# Altium footprint library Miscellaneous Devices.PcbLib: 277 footprints (part 8 of 18)
Each footprint in its own frame and in the unit in brackets; x right, y up, seen from the top. Pads: shape width x height; smd on the part's side, far side on the other; paste and mask are expansions set on the pad; w line width, h text height; cw(c..) or ccw(c..) is an arc to the next point about the centre after c.
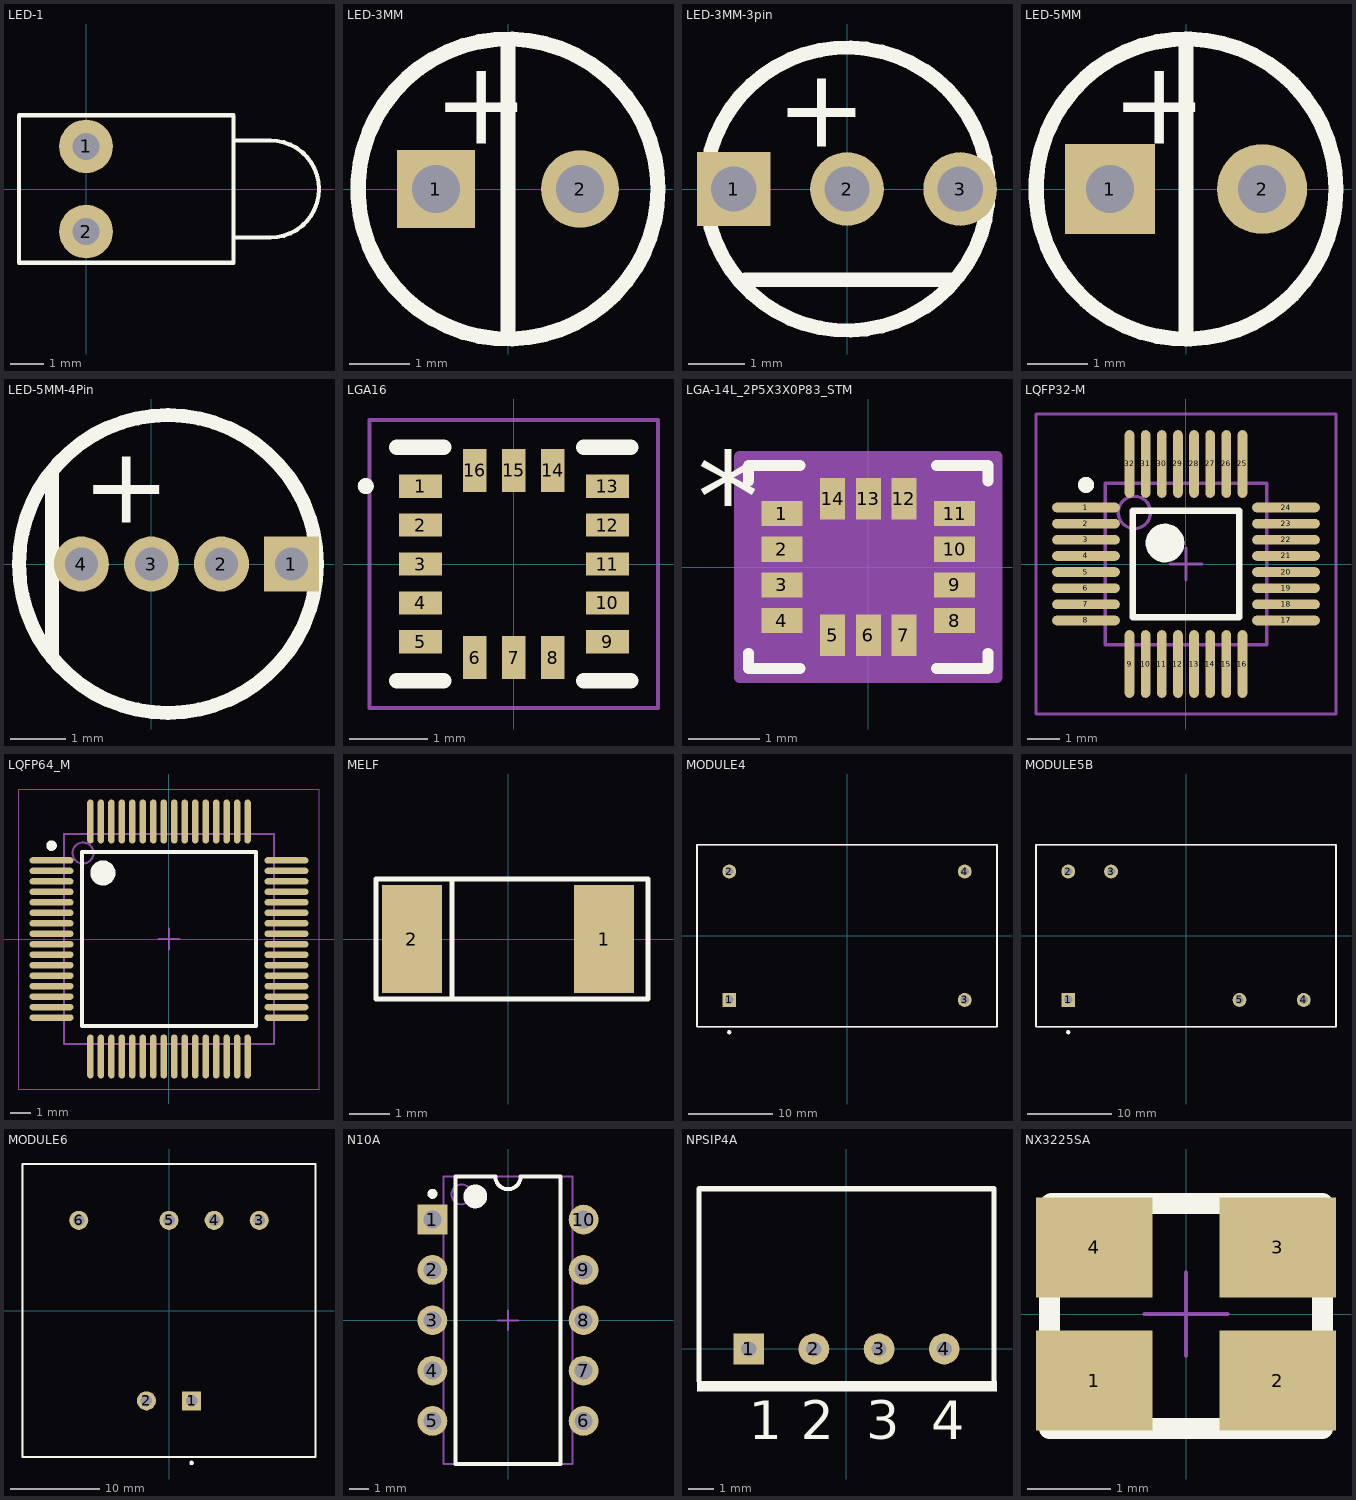
[diagram p7: the footprints below, top view; thin cyan lines are the x and y axes]

## LED-1 [mm] "LED; 2 Leads"
pads (2):
  round 1.6 hole 0.8: 1(0,1.27) 2(0,-1.27)
Top Overlay:
  lines w0.127: 4.4,-1.45 5.5,-1.45 ccw(c5.5,0) 5.5,1.45 4.4,1.45 ; -2,-2.2 -2,2.2 4.4,2.2 4.4,-2.2 -2,-2.2

## LED-3MM [mm] "LED-3MM"
pads (2):
  rect 1.3x1.3 hole 0.8: 1(-1.2,0)
  round 1.3 hole 0.8: 2(1.2,0)
Top Overlay:
  circle w0.254: c0,0 r2.5
  lines w0.254: 0,-2.425 0,2.475
  text "+" at -1.25,0.75 h1.4
3D body "CircuitWorks-LED DIP 3MM.step": height 6.5, standoff -2, extent -1.825,-1.925 1.675,1.875

## LED-3MM-3pin [mm] "LED-3MM 3 Pin comm cathode"
pads (3):
  rect 1.3x1.3 hole 0.8: 1(-2,0)
  round 1.3 hole 0.8: 2(0,0) 3(2,0)
Top Overlay:
  circle w0.254: c0,0 r2.5
  lines w0.254: -1.8,-1.6 1.9,-1.6
  text "+" at -1.25,0.75 h1.4
3D body "User Library-LED RG.step": height 9.43, standoff -4, extent -2.25,-2 2.25,2

## LED-5MM [mm] "LED-5MM"
pads (2):
  rect 1.5x1.5 hole 0.8: 1(-1.27,0)
  round 1.5 hole 0.8: 2(1.27,0)
Top Overlay:
  circle w0.254: c0,0 r2.5
  lines w0.254: 0,-2.5 0,2.5
  text "+" at -1.25,0.75 h1.4
3D body "User Library-LED5ON-Red.STEP": height 8.5, standoff -5, extent -3,-3 2.5,3

## LED-5MM-4Pin [mm] "LED-5MM-4Pin"
pads (4):
  rect 1x1 hole 0.6: 1(2.54,0)
  round 1 hole 0.6: 2(1.27,0) 3(0,0) 4(-1.27,0)
Top Overlay:
  circle w0.254: c0.3,0 r2.702
  lines w0.254: -1.8,-1.7 -1.8,1.6
  text "+" at -1.25,0.75 h1.4
3D body "User Library-LED5ON-Red.STEP": height 8.5, standoff -5, extent -2.5,-2.9 3,3.1

## LGA16 [mm]
pads (16):
  rect 0.55x0.3 smd: 1(-1.2,1) 2(-1.2,0.5) 3(-1.2,0) 4(-1.2,-0.5) 5(-1.2,-1) 9(1.2,-1) 10(1.2,-0.5) 11(1.2,0) 12(1.2,0.5) 13(1.2,1)
  rect 0.3x0.55 smd: 6(-0.5,-1.2) 7(0,-1.2) 8(0.5,-1.2) 14(0.5,1.2) 15(0,1.2) 16(-0.5,1.2)
Top Overlay:
  region: -2,1 -2,1.003 -2,1.008 -1.999,1.013 -1.998,1.018 -1.997,1.023 -1.996,1.028 -1.994,1.033 -1.992,1.038 -1.99,1.043 -1.988,1.048 -1.985,1.052 -1.982,1.057 -1.979,1.061 -1.976,1.065 -1.973,1.069 -1.969,1.073 -1.965,1.076 -1.961,1.079 -1.957,1.082 -1.952,1.085 -1.948,1.088 -1.943,1.09 -1.938,1.092 -1.933,1.094 -1.928,1.096 -1.923,1.097 -1.918,1.098 -1.913,1.099 -1.908,1.1 -1.903,1.1 -1.9,1.1 -1.897,1.1 -1.892,1.1 -1.887,1.099 -1.882,1.098 -1.877,1.097 -1.872,1.096 -1.867,1.094 -1.862,1.092 -1.857,1.09 -1.852,1.088 -1.848,1.085 -1.843,1.082 -1.839,1.079 -1.835,1.076 -1.831,1.073 -1.827,1.069 -1.824,1.065 -1.821,1.061 -1.818,1.057 -1.815,1.052 -1.812,1.048 -1.81,1.043 -1.808,1.038 -1.806,1.033 -1.804,1.028 -1.803,1.023 -1.802,1.018 -1.801,1.013 -1.8,1.008 -1.8,1.003 -1.8,1 -1.8,0.997 -1.8,0.992 -1.801,0.987 -1.802,0.982 -1.803,0.977 -1.804,0.972 -1.806,0.967 -1.808,0.962 -1.81,0.957 -1.812,0.952 -1.815,0.948 -1.818,0.943 -1.821,0.939 -1.824,0.935 -1.827,0.931 -1.831,0.927 -1.835,0.924 -1.839,0.921 -1.843,0.918 -1.848,0.915 -1.852,0.912 -1.857,0.91 -1.862,0.908 -1.867,0.906 -1.872,0.904 -1.877,0.903 -1.882,0.902 -1.887,0.901 -1.892,0.9 -1.897,0.9 -1.9,0.9 -1.903,0.9 -1.908,0.9 -1.913,0.901 -1.918,0.902 -1.923,0.903 -1.928,0.904 -1.933,0.906 -1.938,0.908 -1.943,0.91 -1.948,0.912 -1.952,0.915 -1.957,0.918 -1.961,0.921 -1.965,0.924 -1.969,0.927 -1.973,0.931 -1.976,0.935 -1.979,0.939 -1.982,0.943 -1.985,0.948 -1.988,0.952 -1.99,0.957 -1.992,0.962 -1.994,0.967 -1.996,0.972 -1.997,0.977 -1.998,0.982 -1.999,0.987 -2,0.992 -2,0.997
  lines w0.2: -1.5,-1.5 -0.9,-1.5 ; -1.5,1.5 -0.9,1.5 ; 0.9,-1.5 1.5,-1.5 ; 0.9,1.5 1.5,1.5
Mechanical 1:
  lines w0.05: -1.85,-1.85 1.85,-1.85 1.85,1.85 -1.85,1.85 -1.85,-1.85
3D body "User Library-LIS331AL.step": height -1.99, standoff -3.01, extent -1.5,-1.5 1.5,1.5

## LGA-14L_2P5X3X0P83_STM [mm]
pads (14):
  rect 0.577x0.352 smd paste+0 mask+0.102: 1(-1.21,0.75) 2(-1.21,0.25) 3(-1.21,-0.25) 4(-1.21,-0.75) 8(1.21,-0.75) 9(1.21,-0.25) 10(1.21,0.25) 11(1.21,0.75)
  rect 0.352x0.577 smd paste+0 mask+0.102: 5(-0.5,-0.956) 6(0,-0.956) 7(0.5,-0.956) 12(0.5,0.956) 13(0,0.956) 14(-0.5,0.956)
Top Overlay:
  lines w0.152: -1.676,-1.207 -1.676,-1.422 -0.957,-1.422 ; -1.676,1.207 -1.676,1.422 -0.957,1.422 ; 0.957,-1.422 1.676,-1.422 1.676,-1.207 ; 0.957,1.422 1.676,1.422 1.676,1.207
  text "*" at -2.4,0.365 h1.27
Mechanical 13:
  lines w0.025: -1.549,0.025 -0.279,1.295 ; -1.549,-1.295 -1.549,1.295 1.549,1.295 1.549,-1.295 -1.549,-1.295 ; -1.549,-0.875 -1.448,-0.875 -1.448,-0.625 -1.549,-0.625 -1.549,-0.875 ; -1.549,-0.375 -1.448,-0.375 -1.448,-0.125 -1.549,-0.125 -1.549,-0.375 ; -1.549,0.125 -1.448,0.125 -1.448,0.375 -1.549,0.375 -1.549,0.125 ; -1.549,0.625 -1.448,0.625 -1.448,0.875 -1.549,0.875 -1.549,0.625 ; -0.625,-1.295 -0.625,-1.194 -0.375,-1.194 -0.375,-1.295 -0.625,-1.295 ; -0.625,1.194 -0.625,1.295 -0.375,1.295 -0.375,1.194 -0.625,1.194 ; -0.125,-1.295 -0.125,-1.194 0.125,-1.194 0.125,-1.295 -0.125,-1.295 ; -0.125,1.194 -0.125,1.295 0.125,1.295 0.125,1.194 -0.125,1.194 ; 0.375,-1.295 0.375,-1.194 0.625,-1.194 0.625,-1.295 0.375,-1.295 ; 0.375,1.194 0.375,1.295 0.625,1.295 0.625,1.194 0.375,1.194 ; 1.448,-0.875 1.448,-0.625 1.549,-0.625 1.549,-0.875 1.448,-0.875 ; 1.448,-0.375 1.448,-0.125 1.549,-0.125 1.549,-0.375 1.448,-0.375 ; 1.448,0.125 1.448,0.375 1.549,0.375 1.549,0.125 1.448,0.125 ; 1.448,0.625 1.448,0.875 1.549,0.875 1.549,0.625 1.448,0.625
  text "*" at -1.29,0.365 h1.27
Mechanical 15:
  region: -0.879,-1.549 -1.803,-1.549 -1.803,-1.129 -1.803,1.129 -1.803,1.549 -0.879,1.549 0.879,1.549 1.803,1.549 1.803,1.129 1.803,-1.129 1.803,-1.549 0.879,-1.549
  lines w0.152: -1.803,-1.549 -0.879,-1.549 0.879,-1.549 1.803,-1.549 1.803,-1.129 1.803,1.129 1.803,1.549 0.879,1.549 -0.879,1.549 -1.803,1.549 -1.803,1.129 -1.803,-1.129 -1.803,-1.549
3D body "LGA-14L_2P5X3X0P83_STM.step": height 0.87, standoff 0, extent -1.549,-1.295 1.549,1.295

## LQFP32-M [mm] "32-Pin Thin Plastic Quad Flat Pack 0.5 mm Pitch, IPC Low Density"
height 1.2
pads (32):
  oval 2.1x0.3 smd: 1(-3.1,1.75) 2(-3.1,1.25) 3(-3.1,0.75) 4(-3.1,0.25) 5(-3.1,-0.25) 6(-3.1,-0.75) 7(-3.1,-1.25) 8(-3.1,-1.75) 17(3.1,-1.75) 18(3.1,-1.25) 19(3.1,-0.75) 20(3.1,-0.25) 21(3.1,0.25) 22(3.1,0.75) 23(3.1,1.25) 24(3.1,1.75)
  oval 0.3x2.1 smd: 9(-1.75,-3.1) 10(-1.25,-3.1) 11(-0.75,-3.1) 12(-0.25,-3.1) 13(0.25,-3.1) 14(0.75,-3.1) 15(1.25,-3.1) 16(1.75,-3.1) 25(1.75,3.1) 26(1.25,3.1) 27(0.75,3.1) 28(0.25,3.1) 29(-0.25,3.1) 30(-0.75,3.1) 31(-1.25,3.1) 32(-1.75,3.1)
Top Overlay:
  circle w0.6: c-0.65,0.65 r0.3
  circle w0.25: c-3.1,2.45 r0.125
  lines w0.2: -1.65,-1.65 1.65,-1.65 1.65,1.65 -1.65,1.65 -1.65,-1.65
Mechanical 13:
  circle w0.1: c-1.6,1.6 r0.5
  lines w0.1: -2.5,-2.5 2.5,-2.5 2.5,2.5 -2.5,2.5 -2.5,-2.5
Mechanical 15:
  lines w0.1: -0.5,0 0.5,0 ; 0,-0.5 0,0.5 ; -4.65,-4.65 4.65,-4.65 4.65,4.65 -4.65,4.65 -4.65,-4.65
3D body "SW3dPS-TQFP32-5.STEP": height 1.15, standoff -0.08, extent -3.5,-3.5 3.5,3.5

## LQFP64_M [mm] "Thin QFP, 64-Leads, Body 10x10mm, Pitch 0.5mm, IPC Low Density"
height 1.6
pads (64):
  oval 2.1x0.3 smd: 1(-5.6,3.75) 2(-5.6,3.25) 3(-5.6,2.75) 4(-5.6,2.25) 5(-5.6,1.75) 6(-5.6,1.25) 7(-5.6,0.75) 8(-5.6,0.25) 9(-5.6,-0.25) 10(-5.6,-0.75) 11(-5.6,-1.25) 12(-5.6,-1.75) 13(-5.6,-2.25) 14(-5.6,-2.75) 15(-5.6,-3.25) 16(-5.6,-3.75) 33(5.6,-3.75) 34(5.6,-3.25) 35(5.6,-2.75) 36(5.6,-2.25) 37(5.6,-1.75) 38(5.6,-1.25) 39(5.6,-0.75) 40(5.6,-0.25) 41(5.6,0.25) 42(5.6,0.75) 43(5.6,1.25) 44(5.6,1.75) 45(5.6,2.25) 46(5.6,2.75) 47(5.6,3.25) 48(5.6,3.75)
  oval 0.3x2.1 smd: 17(-3.75,-5.6) 18(-3.25,-5.6) 19(-2.75,-5.6) 20(-2.25,-5.6) 21(-1.75,-5.6) 22(-1.25,-5.6) 23(-0.75,-5.6) 24(-0.25,-5.6) 25(0.25,-5.6) 26(0.75,-5.6) 27(1.25,-5.6) 28(1.75,-5.6) 29(2.25,-5.6) 30(2.75,-5.6) 31(3.25,-5.6) 32(3.75,-5.6) 49(3.75,5.6) 50(3.25,5.6) 51(2.75,5.6) 52(2.25,5.6) 53(1.75,5.6) 54(1.25,5.6) 55(0.75,5.6) 56(0.25,5.6) 57(-0.25,5.6) 58(-0.75,5.6) 59(-1.25,5.6) 60(-1.75,5.6) 61(-2.25,5.6) 62(-2.75,5.6) 63(-3.25,5.6) 64(-3.75,5.6)
Top Overlay:
  circle w0.6: c-3.15,3.15 r0.3
  circle w0.25: c-5.6,4.45 r0.125
  lines w0.2: -4.15,-4.15 4.15,-4.15 4.15,4.15 -4.15,4.15 -4.15,-4.15
Mechanical 13:
  circle w0.1: c-4.1,4.1 r0.5
  lines w0.1: -5,-5 5,-5 5,5 -5,5 -5,-5
Mechanical 15:
  lines w0.05: -7.15,-7.15 7.15,-7.15 7.15,7.15 -7.15,7.15 -7.15,-7.15
  lines w0.1: -0.5,0 0.5,0 ; 0,-0.5 0,0.5
3D body "User Library-TQFP64_Grid_0_5.STEP": height 1.2, standoff 0, extent -6,-6 6,6

## MELF [mm] "Diode; 2 Leads"
pads (2):
  rect 1.5x2.7 smd: 1(2.4,0) 2(-2.4,0)
Top Overlay:
  lines w0.127: -1.4,1.5 -1.397,-1.5 ; -3.302,-1.5 -3.302,1.5 3.5,1.5 3.5,-1.5 -3.302,-1.5
Mechanical 1:
  lines w0.025: -3.3,-1.5 3.5,-1.5 ; -3.3,1.5 3.5,1.5
3D body "User Library-DL-41.STEP": height 2.4, standoff 0, extent -2.5,-1.1 2.5,1.3

## MODULE4 [mm] "DIP; 4 Round Pins; Row Space 27.94 mm; Pitch 15.24 mm"
height 14
pads (4):
  rect 1.65x1.65 hole 1: 1(-13.97,-7.62)
  round 1.65 hole 1: 2(-13.97,7.62) 3(13.97,-7.62) 4(13.97,7.62)
Top Overlay:
  circle w0.25: c-13.97,-11.45 r0.125
  lines w0.2: -17.8,-10.8 -17.8,10.8 17.8,10.8 17.8,-10.8 -17.8,-10.8
Mechanical 13:
  lines w0.1: -17.8,-10.8 -17.8,10.8 17.8,10.8 17.8,-10.8 -17.8,-10.8
3D body: height 14, standoff 0, extent -17.8,-10.8 17.8,10.8

## MODULE5B [mm] "DIP; 5 Round Pins; Row Space 15.24 mm; Pitch 2.54 mm"
height 14
pads (5):
  rect 1.65x1.65 hole 1: 1(-13.97,-7.62)
  round 1.65 hole 1: 2(-13.97,7.62) 3(-8.89,7.62) 4(13.97,-7.62) 5(6.35,-7.62)
Top Overlay:
  circle w0.25: c-13.97,-11.45 r0.125
  lines w0.2: -17.8,-10.8 -17.8,10.8 17.8,10.8 17.8,-10.8 -17.8,-10.8
Mechanical 13:
  lines w0.1: -17.8,-10.8 17.8,-10.8 17.8,10.8 -17.8,10.8 -17.8,-10.8
3D body: height 14, standoff 0, extent -17.8,-10.8 17.8,10.8

## MODULE6 [mm] "DIP; 6 Round Pins; Row Space 20.32 mm; Pitch 2.54 mm"
height 16.5
pads (6):
  rect 2.15x2.15 hole 1.3: 1(2.54,-10.16)
  round 2.15 hole 1.3: 2(-2.54,-10.16) 3(10.16,10.16) 4(5.08,10.16) 5(0,10.16) 6(-10.16,10.16)
Top Overlay:
  circle w0.25: c2.54,-17.15 r0.125
  lines w0.2: -16.5,-16.5 -16.5,16.5 16.5,16.5 16.5,-16.5 -16.5,-16.5
Mechanical 13:
  lines w0.1: -16.5,-16.5 -16.5,16.5 16.5,16.5 16.5,-16.5 -16.5,-16.5
3D body: height 16.5, standoff 0, extent -16.5,-16.5 16.5,16.5

## N10A [mm] "DIP; 10 Leads; Row Spacing 7.62 mm; Pitch 2.54 mm"
height 5.08
pads (10):
  rect 1.5x1.5 hole 0.9: 1(-3.81,5.08)
  round 1.5 hole 0.9: 2(-3.81,2.54) 3(-3.81,0) 4(-3.81,-2.54) 5(-3.81,-5.08) 6(3.81,-5.08) 7(3.81,-2.54) 8(3.81,0) 9(3.81,2.54) 10(3.81,5.08)
Top Overlay:
  circle w0.6: c-1.65,6.25 r0.3
  circle w0.25: c-3.81,6.38 r0.125
  lines w0.2: -2.65,-7.25 2.65,-7.25 2.65,7.25 0.635,7.25 cw(c0,7.25) -0.635,7.25 -2.65,7.25 -2.65,-7.25
Mechanical 13:
  circle w0.1: c-2.35,6.35 r0.5
  lines w0.1: -3.25,-7.25 3.25,-7.25 3.25,7.25 -3.25,7.25 -3.25,-7.25
Mechanical 15:
  lines w0.1: -0.5,0 0.5,0 ; 0,-0.5 0,0.5
3D body: height 5.08, standoff 0, extent -3.25,-7.25 3.25,7.25

## NPSIP4A [mm] "SIP; 4 Leads; Body 10 x 11.5 x 7.5 mm (typ); Pitch 2.54 mm"
height 10.6
pads (4):
  rect 1.2x1.2 hole 0.6: 1(-3.81,0)
  round 1.2 hole 0.6: 2(-1.27,0) 3(1.27,0) 4(3.81,0)
Top Overlay:
  rectangle: -5.83,-1.65 5.87,-1.25
  lines w0.2: -5.75,-1.25 -5.75,6.25 5.75,6.25 5.75,-1.25
  text "4" at 3.302,-3.52 h1.5
  text "3" at 0.762,-3.52 h1.5
  text "2" at -1.778,-3.52 h1.5
  text "1" at -3.81,-3.52 h1.5

## NX3225SA [mm] "SMT body 2.5x3.2"
height 0.5
pads (4):
  rect 1.4x1.2 smd: 1(-1.1,-0.8) 2(1.1,-0.8) 3(1.1,0.8) 4(-1.1,0.8)
Top Overlay:
  lines w0.254: -1.637,1.3 -1.637,-1.375 1.637,-1.375 1.637,1.3 ; -1.612,1.325 1.637,1.325 ; 1.575,1.275 1.575,1.3
Mechanical 15:
  lines w0.05: -0.5,0 0.5,0 ; 0,-0.5 0,0.5 ; -1.7,-1.4 -1.7,1.4 1.7,1.4 1.7,-1.4 -1.7,-1.4
3D body: height 0.9, standoff 0, extent -1.675,-1.4 1.675,1.3